# Altium footprint library Capacitors.PcbLib: 240 footprints (part 13 of 15)
Each footprint in its own frame and in the unit in brackets; x right, y up, seen from the top. Pads: shape width x height; smd on the part's side, far side on the other; paste and mask are expansions set on the pad; w line width, h text height; cw(c..) or ccw(c..) is an arc to the next point about the centre after c.
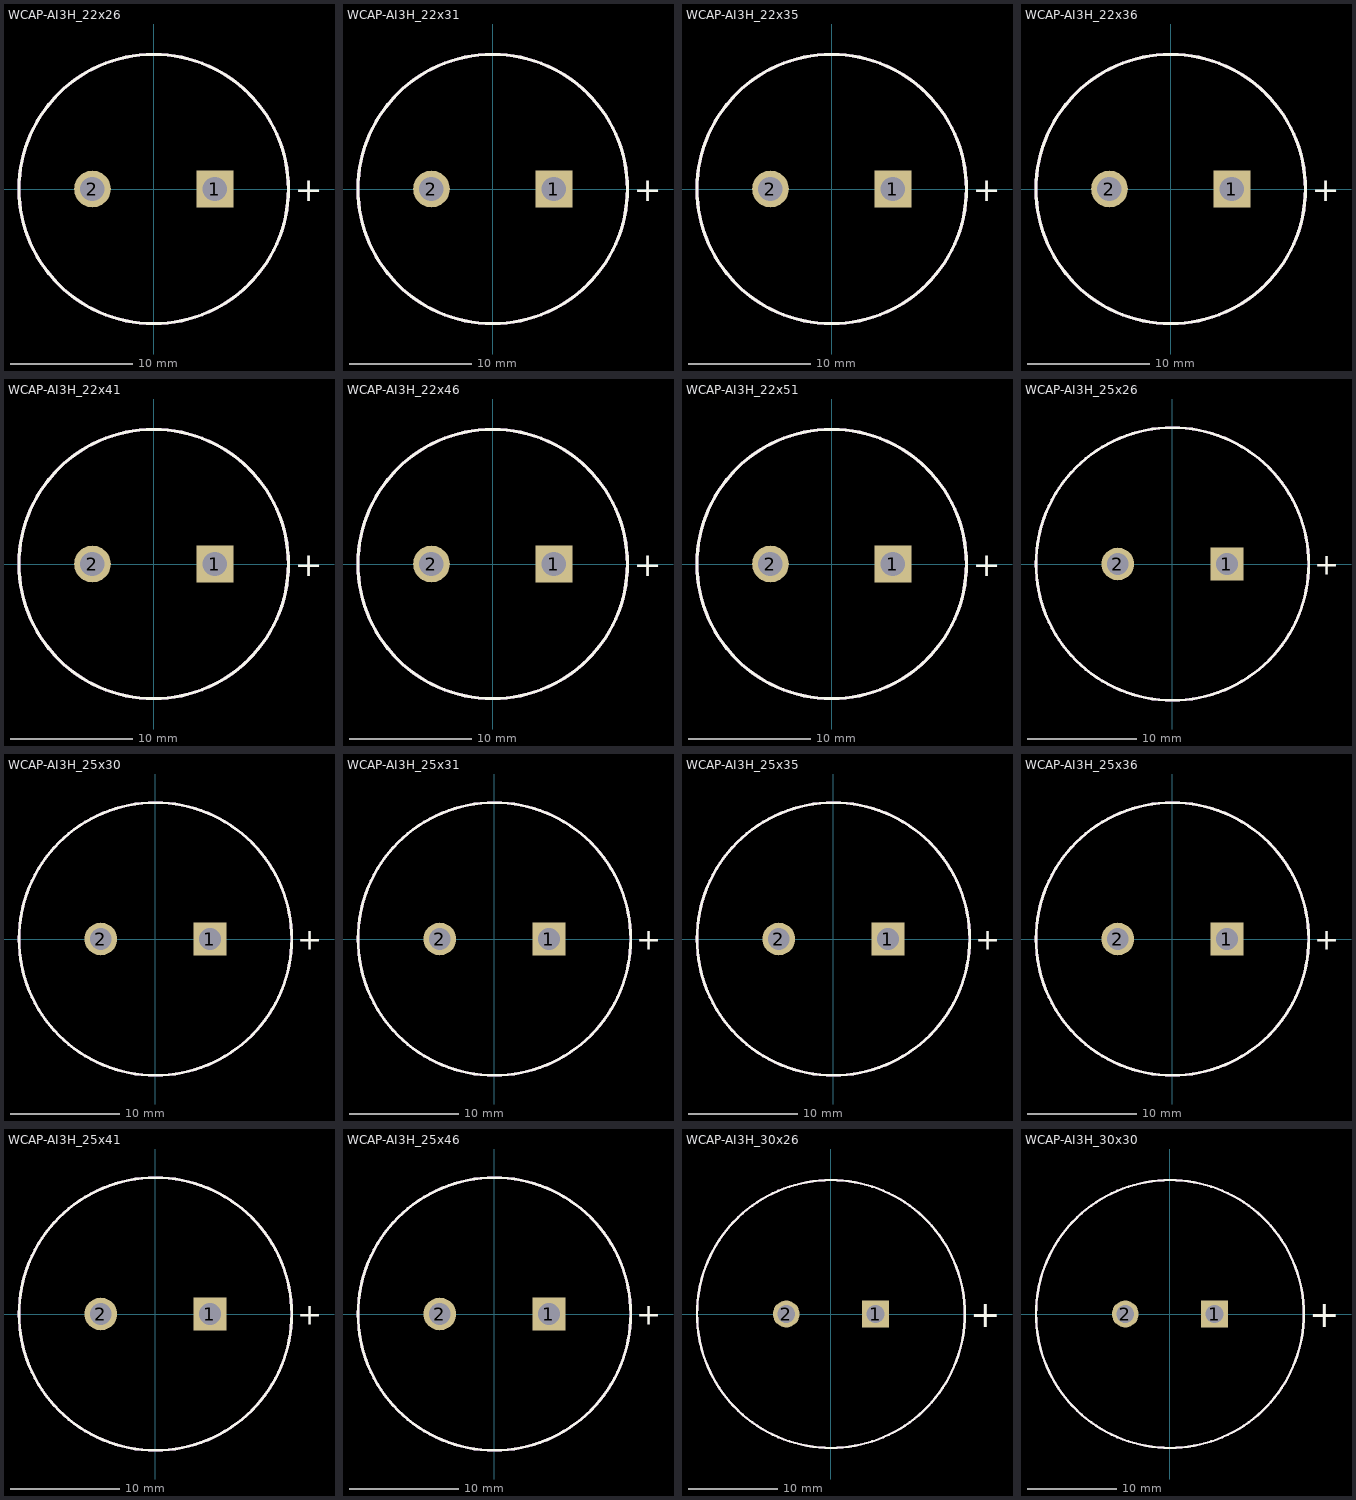
[diagram p12: the footprints below, top view; thin cyan lines are the x and y axes]

## WCAP-AI3H_22x26 [mm] "Aluminium Electrolytic Snap-In Capacitors, Ф22x26mm"
height 26
pads (2):
  rect 3x3 hole 2: 1(5,0)
  round 3 hole 2: 2(-5,0)
Top Overlay:
  circle w0.254: c0,0 r11
  text "+" at 11.5,-1 h2
Mechanical 13:
  circle w0.254: c0,0 r11
3D body "22x26.stp": height 26.09, standoff -6.05, extent -15.545,-15.519 15.476,15.502

## WCAP-AI3H_22x31 [mm] "Aluminium Electrolytic Snap-In Capacitors, Ф22x31mm"
height 31
pads (2):
  rect 3x3 hole 2: 1(5,0)
  round 3 hole 2: 2(-5,0)
Top Overlay:
  circle w0.254: c0,0 r11
  text "+" at 11.5,-1 h2
Mechanical 13:
  circle w0.254: c0,0 r11
3D body "22x31.stp": height 31.09, standoff -6.05, extent -15.545,-15.519 15.476,15.502

## WCAP-AI3H_22x35 [mm] "Aluminium Electrolytic Snap-In Capacitors, Ф22x35mm"
height 35
pads (2):
  rect 3x3 hole 2: 1(5,0)
  round 3 hole 2: 2(-5,0)
Top Overlay:
  circle w0.254: c0,0 r11
  text "+" at 11.5,-1 h2
Mechanical 13:
  circle w0.254: c0,0 r11
3D body "22x35.stp": height 35.09, standoff -6.05, extent -15.557,-15.556 15.553,15.554

## WCAP-AI3H_22x36 [mm] "Aluminium Electrolytic Snap-In Capacitors, Ф22x36mm"
height 36
pads (2):
  rect 3x3 hole 2: 1(5,0)
  round 3 hole 2: 2(-5,0)
Top Overlay:
  circle w0.254: c0,0 r11
  text "+" at 11.5,-1 h2
Mechanical 13:
  circle w0.254: c0,0 r11
3D body "22x36.stp": height 36.09, standoff -6.05, extent -15.547,-15.521 15.476,15.502

## WCAP-AI3H_22x41 [mm] "Aluminium Electrolytic Snap-In Capacitors, Ф22x41mm"
height 41
pads (2):
  rect 3x3 hole 2: 1(5,0)
  round 3 hole 2: 2(-5,0)
Top Overlay:
  circle w0.254: c0,0 r11
  text "+" at 11.5,-1 h2
Mechanical 13:
  circle w0.254: c0,0 r11
3D body "22x41.stp": height 41.09, standoff -6.05, extent -15.546,-15.52 15.476,15.502

## WCAP-AI3H_22x46 [mm] "Aluminium Electrolytic Snap-In Capacitors, Ф22x46mm"
height 46
pads (2):
  rect 3x3 hole 2: 1(5,0)
  round 3 hole 2: 2(-5,0)
Top Overlay:
  circle w0.254: c0,0 r11
  text "+" at 11.5,-1 h2
Mechanical 13:
  circle w0.254: c0,0 r11
3D body "22x46.stp": height 46.09, standoff -6.05, extent -15.547,-15.521 15.476,15.502

## WCAP-AI3H_22x51 [mm] "Aluminium Electrolytic Snap-In Capacitors, Ф22x51mm"
height 51
pads (2):
  rect 3x3 hole 2: 1(5,0)
  round 3 hole 2: 2(-5,0)
Top Overlay:
  circle w0.254: c0,0 r11
  text "+" at 11.5,-1 h2
Mechanical 13:
  circle w0.254: c0,0 r11
3D body "22x51.stp": height 51.09, standoff -6.05, extent -15.546,-15.52 15.476,15.502

## WCAP-AI3H_25x26 [mm] "Aluminium Electrolytic Snap-In Capacitors, Ф25x26mm"
height 26
pads (2):
  rect 3x3 hole 2: 1(5,0)
  round 3 hole 2: 2(-5,0)
Top Overlay:
  circle w0.254: c0,0 r12.5
  text "+" at 13,-1 h2
Mechanical 13:
  circle w0.254: c0,0 r12.5
3D body "25x26.stp": height 26.09, standoff -6.05, extent -17.665,-17.636 17.587,17.616

## WCAP-AI3H_25x30 [mm] "Aluminium Electrolytic Snap-In Capacitors, Ф25x30mm"
height 30
pads (2):
  rect 3x3 hole 2: 1(5,0)
  round 3 hole 2: 2(-5,0)
Top Overlay:
  circle w0.254: c0,0 r12.5
  text "+" at 13,-1 h2
Mechanical 13:
  circle w0.254: c0,0 r12.5
3D body "25x30.stp": height 30.09, standoff -6.05, extent -17.676,-17.677 17.673,17.673

## WCAP-AI3H_25x31 [mm] "Aluminium Electrolytic Snap-In Capacitors, Ф25x31mm"
height 31
pads (2):
  rect 3x3 hole 2: 1(5,0)
  round 3 hole 2: 2(-5,0)
Top Overlay:
  circle w0.254: c0,0 r12.5
  text "+" at 13,-1 h2
Mechanical 13:
  circle w0.254: c0,0 r12.5
3D body "25x31.stp": height 31.09, standoff -6.05, extent -17.666,-17.636 17.587,17.616

## WCAP-AI3H_25x35 [mm] "Aluminium Electrolytic Snap-In Capacitors, Ф25x35mm"
height 35
pads (2):
  rect 3x3 hole 2: 1(5,0)
  round 3 hole 2: 2(-5,0)
Top Overlay:
  circle w0.254: c0,0 r12.5
  text "+" at 13,-1 h2
Mechanical 13:
  circle w0.254: c0,0 r12.5
3D body "25x35.stp": height 35.09, standoff -6.05, extent -17.676,-17.677 17.673,17.673

## WCAP-AI3H_25x36 [mm] "Aluminium Electrolytic Snap-In Capacitors, Ф25x36mm"
height 36
pads (2):
  rect 3x3 hole 2: 1(5,0)
  round 3 hole 2: 2(-5,0)
Top Overlay:
  circle w0.254: c0,0 r12.5
  text "+" at 13,-1 h2
Mechanical 13:
  circle w0.254: c0,0 r12.5
3D body "25x36.stp": height 36.09, standoff -6.05, extent -17.666,-17.636 17.587,17.616

## WCAP-AI3H_25x41 [mm] "Aluminium Electrolytic Snap-In Capacitors, Ф25x41mm"
height 41
pads (2):
  rect 3x3 hole 2: 1(5,0)
  round 3 hole 2: 2(-5,0)
Top Overlay:
  circle w0.254: c0,0 r12.5
  text "+" at 13,-1 h2
Mechanical 13:
  circle w0.254: c0,0 r12.5
3D body "25x41.stp": height 41.09, standoff -6.05, extent -17.666,-17.636 17.587,17.616

## WCAP-AI3H_25x46 [mm] "Aluminium Electrolytic Snap-In Capacitors, Ф25x46mm"
height 46
pads (2):
  rect 3x3 hole 2: 1(5,0)
  round 3 hole 2: 2(-5,0)
Top Overlay:
  circle w0.254: c0,0 r12.5
  text "+" at 13,-1 h2
Mechanical 13:
  circle w0.254: c0,0 r12.5
3D body "25x46.stp": height 46.09, standoff -6.05, extent -17.665,-17.636 17.587,17.616

## WCAP-AI3H_30x26 [mm] "Aluminium Electrolytic Snap-In Capacitors, Ф30x26mm"
height 26
pads (2):
  rect 3x3 hole 2: 1(5,0)
  round 3 hole 2: 2(-5,0)
Top Overlay:
  circle w0.254: c0,0 r15
  text "+" at 15.6,-1.5 h3
Mechanical 13:
  circle w0.254: c0,0 r15
3D body "30x26.stp": height 26.09, standoff -6.05, extent -21.198,-21.163 21.104,21.139

## WCAP-AI3H_30x30 [mm] "Aluminium Electrolytic Snap-In Capacitors, Ф30x30mm"
height 30
pads (2):
  rect 3x3 hole 2: 1(5,0)
  round 3 hole 2: 2(-5,0)
Top Overlay:
  circle w0.254: c0,0 r15
  text "+" at 15.6,-1.5 h3
Mechanical 13:
  circle w0.254: c0,0 r15
3D body "30x30.stp": height 30.09, standoff -6.05, extent -21.212,-21.213 21.213,21.211